# Altium integrated library Relays.IntLib: 47 symbols
Pins are listed as number, name and electrical type; pins without a type are passive.

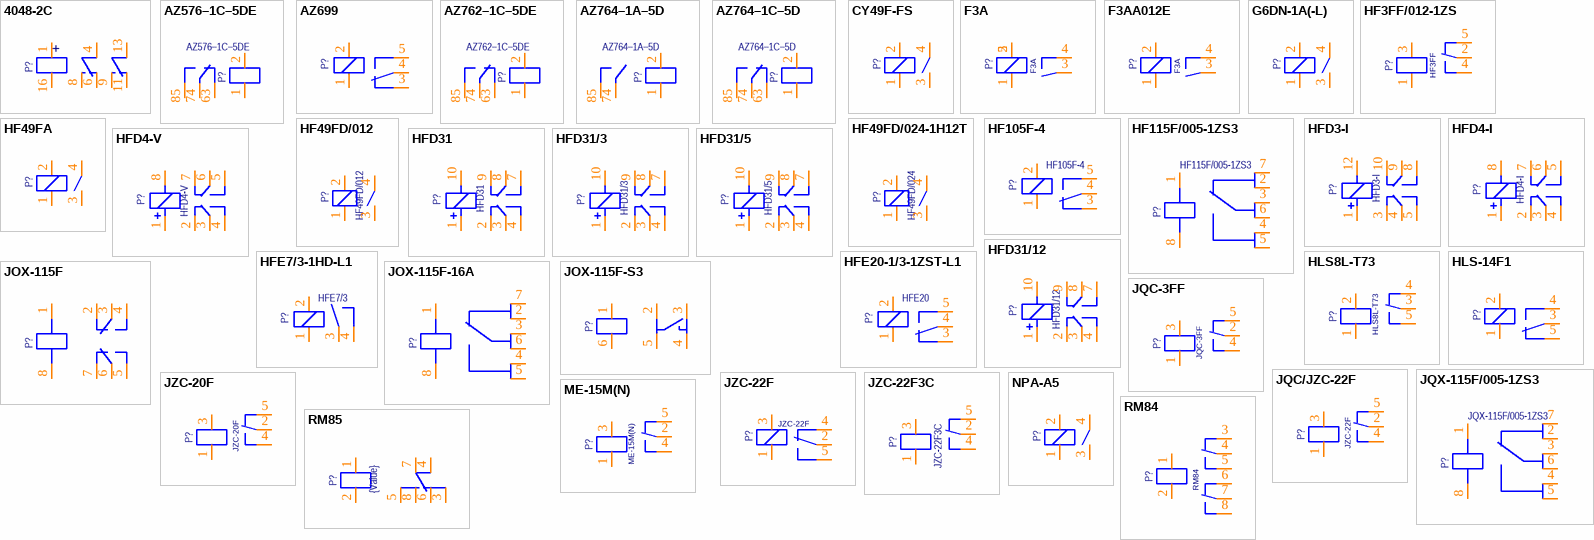
[diagram p0: symbols 4048-2C to RM85]

## 4048-2C
designator P?  (value not drawn)
Value: {Value}; Note: Relays; Temp.Characteristic: -40C to +85C; Coil voltage form: DC AC; Contact arrangement: 1 Form C, 1 Form B, 1 Form A; Publisher: Catcatcat Electronics; website developer: http://catcatcat.d-lan.dp.ua/; Assembly type: Manual Part
footprint REL-2F
pins: 1 -, 4 con, 6 rst, 8 set, 9 set, 11 rst, 13 con, 16 +

## AZ576–1C–5DE
designator P?
1 Form C 20 Amp switching; Note: Relays; Temp.Characteristic: -40C to +85C; Coil resistance（Ω）: 62; Coil voltage: 5V; Coil voltage form: DC; Contact arrangement: 1 Form C; Electrial eddurance min: 100000; Package / Case: DIP; Publisher: Catcatcat Electronics; HelpURL: https://www.azettler.com/pdfs/az576.pdf; Manufacturer PartNumber: AZ576–1C–5DE; website developer: http://catcatcat.d-lan.dp.ua/; Assembly type: Manual Part; Value: AZ576–1C–5DE
footprint AZ764 1 Form C (1 Form C)
pins: 1, 2, 63, 74, 85

## AZ699
designator P?  (value not drawn)
Value: {Value}; Note: Relays; Temp.Characteristic: -40C to +85C; Coil voltage form: DC AC; Contact arrangement: 1 Form C, 1 Form B, 1 Form A; Publisher: Catcatcat Electronics; website developer: http://catcatcat.d-lan.dp.ua/; Assembly type: Manual Part
footprint V23092-A1012-A302
pins: 1, 2, 3, 4, 5

## AZ762–1C–5DE
designator P?
16 Amp switching; Note: Relays; Temp.Characteristic: -40C to +85C; Coil resistance（Ω）: 62; Coil voltage: 5V; Coil voltage form: DC; Contact arrangement: 1 Form C; Electrial eddurance min: 100000; Package / Case: DIP; Publisher: Catcatcat Electronics; HelpURL: https://www.azettler.com/pdfs/az762.pdf; Manufacturer PartNumber: AZ762–1C–5DE; website developer: http://catcatcat.d-lan.dp.ua/; Assembly type: Manual Part; Value: AZ762–1C–5DE
footprint AZ762
pins: 1, 2, 63, 74, 85

## AZ764–1A–5D
designator P?
1 Form A 16 Amp switching; Note: Relays; Temp.Characteristic: -40C to +85C; Coil resistance（Ω）: 62; Coil voltage: 5V; Coil voltage form: DC; Contact arrangement: 1 Form A; Electrial eddurance min: 100000; Package / Case: DIP; Publisher: Catcatcat Electronics; HelpURL: https://www.azettler.com/pdfs/az764.pdf; Manufacturer PartNumber: AZ764–1A–5D; website developer: http://catcatcat.d-lan.dp.ua/; Assembly type: Manual Part; Value: AZ764–1A–5D
footprint AZ764 1 Form A (1 Form A)
pins: 1, 2, 74, 85

## AZ764–1C–5D
designator P?
1 Form C 16 Amp switching; Note: Relays; Temp.Characteristic: -40C to +85C; Coil resistance（Ω）: 62; Coil voltage: 5V; Coil voltage form: DC; Contact arrangement: 1 Form C; Electrial eddurance min: 100000; Package / Case: DIP; Publisher: Catcatcat Electronics; HelpURL: https://www.azettler.com/pdfs/az764.pdf; Manufacturer PartNumber: AZ764–1C–5D; website developer: http://catcatcat.d-lan.dp.ua/; Assembly type: Manual Part; Value: AZ764–1C–5D
footprint AZ764 1 Form C (1 Form C)
pins: 1, 2, 63, 74, 85

## CY49F-FS
designator P?  (value not drawn)
Value: {Value}; Note: Relays; Temp.Characteristic: -40C to +85C; Coil voltage form: DC AC; Contact arrangement: 1 Form C, 1 Form B, 1 Form A; Publisher: Catcatcat Electronics; website developer: http://catcatcat.d-lan.dp.ua/; Assembly type: Manual Part
footprint CY49F-xVDC-F-x
footprint CY49F-xVDC-FS-x
footprint CY49F-xVDC-S-x
pins: 1, 2, 3, 4

## F3A
designator P?  (value not drawn)
Value: {Value}; Note: Relays; Temp.Characteristic: -40C to +85C; Coil voltage form: DC AC; Contact arrangement: 1 Form C, 1 Form B, 1 Form A; Publisher: Catcatcat Electronics; website developer: http://catcatcat.d-lan.dp.ua/; Assembly type: Manual Part
footprint F3AA012E
pins: 1, 2, 3, 4, 5

## F3AA012E
designator P?  (value not drawn)
Value: {Value}; Note: Relays; Temp.Characteristic: -40C to +85C; Coil voltage form: DC AC; Contact arrangement: 1 Form C, 1 Form B, 1 Form A; Publisher: Catcatcat Electronics; website developer: http://catcatcat.d-lan.dp.ua/; Assembly type: Manual Part
footprint F3AA012E
pins: 1, 2, 3, 4
text: F3A

## G6DN-1A(-L)
designator P?  (value not drawn)
Value: {Value}; Note: Relays; Temp.Characteristic: -40C to +85C; Coil voltage form: DC AC; Contact arrangement: 1 Form C, 1 Form B, 1 Form A; Publisher: Catcatcat Electronics; website developer: http://catcatcat.d-lan.dp.ua/; Assembly type: Manual Part
footprint G6DN-1A(-L) (5 A)
pins: 1, 2, 3, 4

## HF3FF/012-1ZS
designator P?  (value not drawn)
10 A (12VDC); Value: HF3FF/012-1ZS; Pricing Аlternative: 0.12; Note: Relays; Temp.Characteristic: -40C to +85C; Voltage: 12 V; Coil voltage form: DC AC; Contact arrangement: 1 Form C, 1 Form B, 1 Form A; Package / Case: DIP; Pricing Digi-Key: 0.45; Publisher: Catcatcat Electronics; website developer: http://catcatcat.d-lan.dp.ua/; Assembly type: Manual Part
footprint JZC-20F
pins: 1, 2 con, 3, 4 rs, 5 set
text: HF3FF

## HF49FA
designator P?  (value not drawn)
Value: {Value}; Note: Relays; Temp.Characteristic: -40C to +85C; Coil voltage form: DC AC; Contact arrangement: 1 Form C, 1 Form B, 1 Form A; Publisher: Catcatcat Electronics; website developer: http://catcatcat.d-lan.dp.ua/; Assembly type: Manual Part
footprint HF49FA
pins: 1, 2, 3, 4

## HF49FD/012
designator P?
12VDC 5A; Note: Relays; Temp.Characteristic: -40C to +85C; Coil resistance（Ω）: 120 Ohm; Coil voltage: 12V; Coil voltage form: DC; Contact arrangement: 1 Form C, 1 Form B, 1 Form A; Package / Case: DIP; Publisher: Catcatcat Electronics; HelpURL: http://www.hongfa.com:8080/pdfjs/web/viewer.html?file=/Uploads/PDF/HF49FD_I_en.pdf&stamp=1582546701746; website developer: http://catcatcat.d-lan.dp.ua/; Assembly type: Manual Part; Value: HF49FD/012
footprint HF49FD
footprint HF49FD/***1H*1
footprint HF49FD/***1H*2
pins: 1, 2, 3, 4

## HF49FD/024-1H12T
designator P?  value HF49FD/024  (hidden comment: HF49FD/024-1H12T)
24VDC 5A; Note: Relays; Temp.Characteristic: -40C to +85C; Coil resistance（Ω）: 120 Ohm; Coil voltage: 24V; Coil voltage form: DC; Contact arrangement: 1 Form C, 1 Form B, 1 Form A; Package / Case: DIP; Publisher: Catcatcat Electronics; HelpURL: http://www.hongfa.com:8080/pdfjs/web/viewer.html?file=/Uploads/PDF/HF49FD_I_en.pdf&stamp=1582546701746; website developer: http://catcatcat.d-lan.dp.ua/; Assembly type: Manual Part
footprint HF49FD
footprint HF49FD/***1H*1
footprint HF49FD/***1H*2
pins: 1, 2, 3, 4

## HF105F-4
designator P?  value HF105F-4  (hidden comment: *)
Реле 1form-A coil=220vac cont=40a 277vac; Manufacturer PartNumber: HF105F-4/220A-1HST; PartNumber Аlternative: HF105F-4/220A-1HST(136); Note: Relays; Temp.Characteristic: -40C to +85C; Coil resistance（Ω）: 13490; Coil voltage: 220V; Coil voltage form: AC; Contact arrangement: 1 Form A; Dealer Аlternative: http://www.microchip.ua/index.php?p=view_prod.php&leng=rus&tl=%CF%F0%EE%E4%F3%EA%F6%E8%FF&tlp=%DD%EB%E5%EA%F2%F0%EE%EC%E5%F5%E0%ED%E8%F7%E5%F1%EA%E8%E5%20%F0%E5%EB%E5&pmen=%D0%E5%EB%E5%20%FD%EB%E5%EA%F2%F0%EE%EC%E0%E3%ED%E8%F2%ED%FB%E5&razd=RAZD062&npm=12&ipm=0&st=3#up; Package / Case: DIP; Publisher: Catcatcat Electronics; HelpURL: http://www.hongfa.com:8080/pdfjs/web/viewer.html?file=/Uploads/PDF/HF105F-4_en.pdf&stamp=1566114387661; website developer: http://catcatcat.d-lan.dp.ua/; Detailed Description: http://www.hongfa.com; Assembly type: Manual Part
footprint HF105F-4
pins: 1, 2, 3, 4, 5

## HF115F/005-1ZS3
designator P?  value HF115F/005-1ZS3  (hidden comment: *)
5VDC SPDT 16A (440VAC , 300VDC) Max DIP RoHS; Manufacturer: Xiamen Hongfa Electroacoustic; PartNumber Аlternative: Реле JQX-115F 16A 1C coil 5VDC; Pricing Аlternative: 1.350; Note: Relays; Temp.Characteristic: -40C to +85C; Detailed Description: Relays General Purpose Non Latching 5VDC SPDT 16A (440VAC , 300VDC) Max DIP RoHS; Coil resistance（Ω）: 62; Coil voltage: 5V; Coil voltage form: DC; Contact arrangement: 1 Form C; Electrial eddurance min: 100000; Dealer Аlternative: https://voron.ua/catalog/017097; Package / Case: DIP; Publisher: Catcatcat Electronics; HelpURL: http://www.hongfa.com:8080/pdfjs/web/viewer.html?file=/Uploads/PDF/HF115F_i_en.pdf&stamp=1566119198551; Manufacturer PartNumber: HF115F/005-1ZS3; website developer: http://catcatcat.d-lan.dp.ua/; Dealer LCSC: https://lcsc.com/product-detail/Relays_HF115F-05-1ZS3_C9225.html; Manufacturer URL: http://www.hongfa.com/product/detail/e692adbc-7799-469a-98dc-d1d105d3370d; PartNumber LCSC: C9225; Pricing LCSC: 1.3879; Assembly type: Manual Part
footprint HF115F/_1_3 1 Form C
footprint HF115F/_1_3 1 Form C no3D
pins: 1, 2, 3, 4, 5, 6, 7, 8

## HFD3-I
designator P?
Note: Relays; Temp.Characteristic: -40C to +85C; Voltage: 5V; Coil resistance（Ω）: 13490; Coil voltage form: DC; Contact arrangement: 1 Form A; Package / Case: DIP; Publisher: Catcatcat Electronics; website developer: http://catcatcat.d-lan.dp.ua/; Coil voltage: 5V; Assembly type: Manual Part; Value: HFD3-I
footprint HFD3-I DIP (DIP)
footprint HFD3-I S (S)
pins: 1, 3, 4, 5, 8, 9, 10, 12

## HFD4-I
designator P?
Note: Relays; Temp.Characteristic: -40C to +85C; Voltage: 5V; Coil resistance（Ω）: 13490; Coil voltage form: DC; Contact arrangement: 1 Form A; Package / Case: DIP; Publisher: Catcatcat Electronics; website developer: http://catcatcat.d-lan.dp.ua/; Coil voltage: 5V; Assembly type: Manual Part; Value: HFD4-I
footprint HFD4-I DIP (DIP)
footprint HFD4-I SMT
footprint HFD4-I SMT sh
pins: 1, 2, 3, 4, 5, 6, 7, 8

## HFD4-V
designator P?
Note: Relays; Temp.Characteristic: -40C to +85C; Voltage: 5V; Coil resistance（Ω）: 13490; Coil voltage form: DC; Contact arrangement: 1 Form A; Package / Case: DIP; Publisher: Catcatcat Electronics; website developer: http://catcatcat.d-lan.dp.ua/; Coil voltage: 5V; Assembly type: Manual Part; Value: HFD4-V
footprint HFD4-I DIP (DIP)
footprint HFD4-I SMT
footprint HFD4-I SMT sh
pins: 1, 2, 3, 4, 5, 6, 7, 8

## HFD31
designator P?
Note: Relays; Temp.Characteristic: -40C to +85C; Voltage: 5V; Coil resistance（Ω）: 13490; Coil voltage form: DC; Contact arrangement: 1 Form A; Package / Case: DIP; Publisher: Catcatcat Electronics; website developer: http://catcatcat.d-lan.dp.ua/; Coil voltage: 5V; Assembly type: Manual Part; Value: HFD31
footprint HFD31 (DIP)
footprint HFD31 SMT (SMT)
pins: 1, 2, 3, 4, 7, 8, 9, 10

## HFD31/3
designator P?
3VDC DPDT 2A; Manufacturer: Xiamen Hongfa Electroacoustic; Note: Relays; Temp.Characteristic: -40C to +85C; Voltage: 5VDC 2A; Detailed Description: Relays Telecom Non Latching 5VDC DPDT 2A (250VAC , 220VDC) Max Plugin RoHS; Coil resistance（Ω）: 13490; Coil voltage: 5V; Coil voltage form: DC; Package / Case: DIP; Publisher: Catcatcat Electronics; HelpURL: http://www.hongfa.com:8080/pdfjs/web/viewer.html?file=/Uploads/PDF/HFD31_en.pdf; Manufacturer PartNumber: HFD31/3; website developer: http://catcatcat.d-lan.dp.ua/; PartNumber Mouser: http://www.hongfa.com:8080/pdfjs/web/viewer.html?file=/Uploads/PDF/HFD31_en.pdf&stamp=1582545623043; Contact arrangement: DPDT; Assembly type: Manual Part; Value: HFD31/3
footprint HFD31 (DIP)
footprint HFD31 SMT (SMT)
pins: 1, 2, 3, 4, 7, 8, 9, 10

## HFD31/5
designator P?
5VDC DPDT 2A; Manufacturer: Xiamen Hongfa Electroacoustic; Note: Relays; Temp.Characteristic: -40C to +85C; Voltage: 5VDC 2A; Detailed Description: Relays Telecom Non Latching 5VDC DPDT 2A (250VAC , 220VDC) Max Plugin RoHS; Coil resistance（Ω）: 13490; Coil voltage: 5V; Coil voltage form: DC; Package / Case: DIP; Publisher: Catcatcat Electronics; HelpURL: http://www.hongfa.com:8080/pdfjs/web/viewer.html?file=/Uploads/PDF/HFD31_en.pdf; Manufacturer PartNumber: HFD31/5; website developer: http://catcatcat.d-lan.dp.ua/; Contact arrangement: DPDT; Assembly type: Manual Part; Value: HFD31/5
footprint HFD31 (DIP)
footprint HFD31 SMT (SMT)
pins: 1, 2, 3, 4, 7, 8, 9, 10

## HFD31/12
designator P?
12VDC DPDT 2A; Manufacturer: Xiamen Hongfa Electroacoustic; Note: Relays; Temp.Characteristic: -40C to +85C; Voltage: 12VDC 2A; Detailed Description: Relays Telecom Non Latching 5VDC DPDT 2A (250VAC , 220VDC) Max Plugin RoHS; Coil resistance（Ω）: 13490; Coil voltage: 5V; Coil voltage form: DC; Package / Case: DIP; Publisher: Catcatcat Electronics; HelpURL: http://www.hongfa.com:8080/pdfjs/web/viewer.html?file=/Uploads/PDF/HFD31_en.pdf; Manufacturer PartNumber: HFD31/12; website developer: http://catcatcat.d-lan.dp.ua/; Contact arrangement: DPDT; Assembly type: Manual Part; Value: HFD31/12
footprint HFD31 (DIP)
footprint HFD31 SMT (SMT)
pins: 1, 2, 3, 4, 7, 8, 9, 10

## HFE7/3-1HD-L1
designator P?  value HFE7/3  (hidden comment: HFE7/3-1HD-L1)
Реле 1form-A coil=3vdc cont=10a 277vac поляризованое (latching); PartNumber Аlternative: HF105F-4/220A-1HST(136); Note: Relays; Temp.Characteristic: -40C to +85C; Coil resistance（Ω）: 13490; Coil voltage: 220V; Coil voltage form: AC; Contact arrangement: 1 Form A; Dealer Аlternative: http://www.microchip.ua; Package / Case: DIP; Publisher: Catcatcat Electronics; HelpURL: http://www.hongfa.com:8080/pdfjs/web/viewer.html?file=/Uploads/PDF/HFE7_en.pdf&stamp=1603382990751; Manufacturer PartNumber: HFE7/3-1HD-L1; website developer: http://catcatcat.d-lan.dp.ua/; Detailed Description: http://www.hongfa.com; Assembly type: Manual Part
footprint HFE7/3-1HD-L1 1 Form A
pins: 1, 2, 3 4, 4 5

## HFE20-1/3-1ZST-L1
designator P?  value HFE20  (hidden comment: HFE20-1/3-1ZST-L1)
Реле 1form-C coil=3vdc cont=16a 277vac поляризованое (latching); PartNumber Аlternative: HF105F-4/220A-1HST(136); Note: Relays; Temp.Characteristic: -40C to +85C; Coil resistance（Ω）: 13490; Coil voltage: 220V; Coil voltage form: AC; Contact arrangement: 1 Form A; Dealer Аlternative: http://www.microchip.ua; Package / Case: DIP; Publisher: Catcatcat Electronics; HelpURL: http://www.hongfa.com:8080/pdfjs/web/viewer.html?file=/Uploads/PDF/HFE20_en.pdf&stamp=1603385578102; Manufacturer PartNumber: HFE20-1/3-1ZST-L1; website developer: http://catcatcat.d-lan.dp.ua/; Detailed Description: http://www.hongfa.com; Assembly type: Manual Part
footprint HFE20
pins: 1, 2, 3, 4, 5

## HLS8L-T73
designator P?  (value not drawn)
Value: {Value}; Note: Relays; Temp.Characteristic: -40C to +85C; Coil voltage form: DC AC; Contact arrangement: 1 Form C, 1 Form B, 1 Form A; Publisher: Catcatcat Electronics; website developer: http://catcatcat.d-lan.dp.ua/; Assembly type: Manual Part
footprint HLS8L-T73
pins: 1, 2, 3, 4, 5

## HLS-14F1
designator P?  (value not drawn)
Value: {Value}; Note: Relays; Temp.Characteristic: -40C to +85C; Coil voltage form: DC AC; Contact arrangement: 1 Form C, 1 Form B, 1 Form A; Publisher: Catcatcat Electronics; website developer: http://catcatcat.d-lan.dp.ua/; Assembly type: Manual Part
footprint HLS-14F1
pins: 1, 2, 3, 4, 5

## JOX-115F
designator P?  (value not drawn)
Value: {Value}; Note: Relays; Temp.Characteristic: -40C to +85C; Coil voltage form: DC AC; Contact arrangement: 1 Form C, 1 Form B, 1 Form A; Publisher: Catcatcat Electronics; website developer: http://catcatcat.d-lan.dp.ua/; Assembly type: Manual Part
footprint JOX-115F
pins: 1, 2, 3, 4, 5, 6, 7, 8

## JOX-115F-16A
designator P?  (value not drawn)
Value: {Value}; Note: Relays; Temp.Characteristic: -40C to +85C; Coil voltage form: DC AC; Contact arrangement: 1 Form C, 1 Form B, 1 Form A; Publisher: Catcatcat Electronics; website developer: http://catcatcat.d-lan.dp.ua/; Assembly type: Manual Part
footprint JOX-115F
pins: 1, 2, 3, 4, 5, 6, 7, 8

## JOX-115F-S3
designator P?  (value not drawn)
Value: {Value}; Note: Relays; Temp.Characteristic: -40C to +85C; Coil voltage form: DC AC; Contact arrangement: 1 Form C, 1 Form B, 1 Form A; Publisher: Catcatcat Electronics; website developer: http://catcatcat.d-lan.dp.ua/; Assembly type: Manual Part
footprint JOX-115F-S3
pins: 1, 2, 3, 4, 5, 6

## JQC-3FF
designator P?  (value not drawn)
10 A (12VDC); Value: 10 A; Pricing Аlternative: 0.12; Note: Relays; Temp.Characteristic: -40C to +85C; Voltage: 12 V; Coil voltage form: DC AC; Contact arrangement: 1 Form C, 1 Form B, 1 Form A; ComponentLink2URL: http://www.massuse-relay.com/details/English/ME-15M.pdf; Package / Case: DIP; PartNumber Digi-Key: JQC-3FF 012VDC 1H T F S; Pricing Digi-Key: 0.45; Publisher: Catcatcat Electronics; website developer: http://catcatcat.d-lan.dp.ua/; Assembly type: Manual Part
footprint JZC-20F
pins: 1, 2 con, 3, 4 rs, 5 set

## JQC/JZC-22F
designator P?  (value not drawn)
10 A (12VDC); Value: 10 A; Pricing Аlternative: 0.12; Note: Relays; Temp.Characteristic: -40C to +85C; Voltage: 12 V; Coil voltage form: DC AC; Contact arrangement: 1 Form C, 1 Form B, 1 Form A; Package / Case: DIP; PartNumber Digi-Key: JQC/JZC-22F 012VDC 1H S; Pricing Digi-Key: 0.45; Publisher: Catcatcat Electronics; website developer: http://catcatcat.d-lan.dp.ua/; Assembly type: Manual Part
footprint JZC-20F
pins: 1, 2 con, 3, 4 rs, 5 set
text: JZC-22F

## JQX-115F/005-1ZS3
designator P?  value JQX-115F/005-1ZS3  (hidden comment: *)
5VDC SPDT 16A (440VAC , 300VDC) Max DIP RoHS; Manufacturer: Xiamen Hongfa Electroacoustic; PartNumber Аlternative: Реле JQX-115F 16A 1C coil 5VDC; Pricing Аlternative: 1.350; Note: Relays; Temp.Characteristic: -40C to +85C; Coil resistance（Ω）: 62; Coil voltage: 5V; Coil voltage form: DC; Contact arrangement: 1 Form C; Electrial eddurance min: 100000; Dealer Аlternative: https://voron.ua/catalog/017097; Package / Case: DIP; Publisher: Catcatcat Electronics; HelpURL: https://datasheet.lcsc.com/szlcsc/Xiamen-Hongfa-Electroacoustic-JQX-115F-005-1ZS3_C67589.pdf; Manufacturer PartNumber: JQX-115F/005-1ZS3; website developer: http://catcatcat.d-lan.dp.ua/; Dealer LCSC: https://lcsc.com/product-detail/Relays_JQX-115F-005-1ZS3_C67589.html; Manufacturer URL: http://www.hongfa.com/product/detail/e692adbc-7799-469a-98dc-d1d105d3370d; PartNumber LCSC: C67589; Pricing LCSC: 1.3894; Assembly type: Manual Part
footprint HF115F/_1_3 1 Form C
pins: 1, 2, 3, 4, 5, 6, 7, 8

## JZC-20F
designator P?  (value not drawn)
Value: {Value}; Note: Relays; Temp.Characteristic: -40C to +85C; Coil voltage form: DC AC; Contact arrangement: 1 Form C, 1 Form B, 1 Form A; Publisher: Catcatcat Electronics; website developer: http://catcatcat.d-lan.dp.ua/; Assembly type: Manual Part
footprint JZC-20F
pins: 1, 2 con, 3, 4 rs, 5 set

## JZC-22F
designator P?  (value not drawn)
12VDC, 1Z 15 A; Value: 15 A; Pricing Аlternative: 0.25; Note: Relays; Temp.Characteristic: -40C to +85C; Voltage: 12 V; Coil voltage form: DC AC; Contact arrangement: 1 Form C, 1 Form B, 1 Form A; ComponentLink1URL: www.chinarelay.com; ComponentLink2URL: http://relays.chinarelay.com; Dealer Digi-Key: ASIA DRAGON ELECTRIC CO.,LTD [Asiaon]; Package / Case: DIP; PartNumber Digi-Key: JZC-22F 12VDC, 1H; Publisher: Catcatcat Electronics; website developer: http://catcatcat.d-lan.dp.ua/; Assembly type: Manual Part
footprint JZC-22FSC
pins: 1, 2, 3, 4, 5

## JZC-22F3C
designator P?  value JZC-22F3C  (hidden comment: *)
16 A (12VDC); Pricing Аlternative: 0.24; Note: Relays; Temp.Characteristic: -40C to +85C; Voltage: 12 V; Coil voltage form: DC AC; Contact arrangement: 1 Form C, 1 Form B, 1 Form A; Dealer Digi-Key: https://detail.1688.com/offer/547234947025.html; PartNumber Digi-Key: JZC-22F3C 012VDC 1H S; Pricing Digi-Key: 0.45; Publisher: Catcatcat Electronics; PackageType: DIP; website developer: http://catcatcat.d-lan.dp.ua/; Assembly type: Manual Part
footprint JZC-20F
pins: 1, 2 con, 3, 4 rs, 5 set

## ME-15M(N)
designator P?  (value not drawn)
10 A (12VDC); Value: 10 A; Pricing Аlternative: 0.12; Note: Relays; Temp.Characteristic: -40C to +85C; Voltage: 12 V; Coil voltage form: DC AC; Contact arrangement: 1 Form C, 1 Form B, 1 Form A; ComponentLink2URL: http://www.massuse-relay.com/details/English/ME-15M.pdf; Package / Case: DIP; PartNumber Digi-Key: ME-15M(N) 012VDC H T F S; Pricing Digi-Key: 0.45; Publisher: Catcatcat Electronics; website developer: http://catcatcat.d-lan.dp.ua/; Assembly type: Manual Part
footprint JZC-20F
pins: 1, 2 con, 3, 4 rs, 5 set

## NPA-A5
designator P?  (value not drawn)
Value: {Value}; Note: Relays; Temp.Characteristic: -40C to +85C; Coil voltage form: DC AC; Contact arrangement: 1 Form C, 1 Form B, 1 Form A; Publisher: Catcatcat Electronics; website developer: http://catcatcat.d-lan.dp.ua/; Assembly type: Manual Part
footprint NPA-A5
pins: 1, 2, 3, 4

## RM84
designator P?  (value not drawn)
Value: {Value}; Note: Relays; Temp.Characteristic: -40C to +85C; Coil voltage form: DC AC; Contact arrangement: 1 Form C, 1 Form B, 1 Form A; Publisher: Catcatcat Electronics; website developer: http://catcatcat.d-lan.dp.ua/; Assembly type: Manual Part
footprint RM84
pins: 1, 2, 3, 4, 5, 6, 7, 8

## RM85
designator P?  value {Value}  (hidden comment: *)
Note: Relays; Temp.Characteristic: -40C to +85C; Coil voltage form: DC AC; Contact arrangement: 1 Form C, 1 Form B, 1 Form A; Publisher: Catcatcat Electronics; website developer: http://catcatcat.d-lan.dp.ua/; Assembly type: Manual Part
footprint RM84
pins: 1 -, 2 +, 3 rst, 4 con, 5 set, 6 rst, 7 con, 8 set

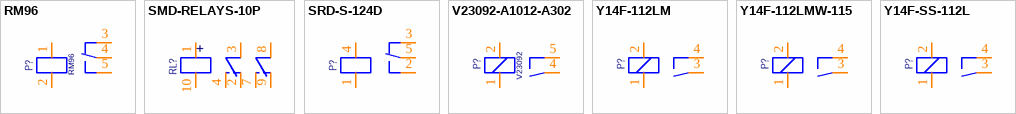
[diagram p1: symbols RM96 to Y14F-SS-112L]

## RM96
designator P?  (value not drawn)
Value: {Value}; Note: Relays; Temp.Characteristic: -40C to +85C; Coil voltage form: DC AC; Contact arrangement: 1 Form C, 1 Form B, 1 Form A; Publisher: Catcatcat Electronics; website developer: http://catcatcat.d-lan.dp.ua/; Assembly type: Manual Part
footprint RM96
pins: 1, 2, 3, 4, 5

## SMD-RELAYS-10P
designator RL?  (value not drawn)
Value: {Value}; Note: Relays; Temp.Characteristic: -40C to +85C; Coil voltage form: DC AC; Contact arrangement: 1 Form C, 1 Form B, 1 Form A; Publisher: Catcatcat Electronics; website developer: http://catcatcat.d-lan.dp.ua/; Assembly type: Manual Part
footprint SMD-RELAYS
pins: 1, 2 rs, 3 con, 4 set, 5 hidden, 6 hidden, 7 set, 8 con, 9 rs, 10
text: +

## SRD-S-124D
designator P?  (value not drawn)
24VDC SPDT 12A Through Hole Relays RoHS; Manufacturer: SANYOU RELAYS; Manufacturer PartNumber: SRD-S-124D; Temp.Characteristic: -40C to +85C; Voltage: (277VAC) Max; Detailed Description: General Purpose Latching, Single Coil 24VDC SPDT 12A Through Hole Relays RoHS; Coil resistance（Ω）: 1500; Coil voltage: 24; Coil voltage form: DC AC; Contact arrangement: 1 Form C, 1 Form B, 1 Form A; Value: 12A; ComponentLink2URL: http://www.massuse-relay.com/details/English/ME-15M.pdf; Package / Case: Through Hole; Publisher: Catcatcat Electronics; Note: Relays; HelpURL: https://datasheet.lcsc.com/szlcsc/1809211229_SANYOU-RELAYS-SRD-S-124D_C276435.pdf; website developer: http://catcatcat.d-lan.dp.ua/; PartNumber LCSC: C276435; Pricing LCSC: 0.518333; Assembly type: Manual Part
footprint SRD-S relays
pins: 1, 2 rs, 3 set, 4, 5 con

## V23092-A1012-A302
designator P?  (value not drawn)
Value: {Value}; Note: Relays; Temp.Characteristic: -40C to +85C; Coil voltage form: DC AC; Contact arrangement: 1 Form C, 1 Form B, 1 Form A; Publisher: Catcatcat Electronics; website developer: http://catcatcat.d-lan.dp.ua/; Assembly type: Manual Part
footprint V23092-A1012-A302
pins: 1, 2, 4, 5
text: V23092

## Y14F-112LM
designator P?  (value not drawn)
29.2*12.8*20.6mm; Value: 16A 1A; Note: Relays; Temp.Characteristic: -40C to +85C; Voltage: 12VDC; Coil voltage form: DC AC; Contact arrangement: 1 Form C, 1 Form B, 1 Form A; ComponentLink1URL: https://detail.1688.com/offer/43514657287.html?spm=a2615.7691456.0.0.d3059e2DYG2du; ComponentLink2URL: http://www.yzrelay.com/products/electromagneticrelay/78.html; Publisher: Catcatcat Electronics; Manufacturer: http://www.yzrelay.com/; website developer: http://catcatcat.d-lan.dp.ua/; Assembly type: Manual Part
footprint Y14F-112LM (29.2*12.8*20.6mm)
pins: 1, 2, 3, 4

## Y14F-112LMW-115
designator P?  (value not drawn)
29.2*12.8*15.7mm; Value: 20A 1A; Note: Relays; Temp.Characteristic: -40C to +85C; Voltage: 12VDC; Coil voltage form: DC AC; Contact arrangement: 1 Form C, 1 Form B, 1 Form A; ComponentLink1URL: http://www.yzrelay.com/products/electromagneticrelay/76.html; ComponentLink2URL: https://detail.1688.com/offer/522018460035.html?spm=b26110380.sw1688.mof001.13.La7iS8; Publisher: Catcatcat Electronics; Manufacturer: http://www.yzrelay.com/; website developer: http://catcatcat.d-lan.dp.ua/; Assembly type: Manual Part
footprint Y14F-112LMW-115 (29.2*12.8*15.7mm)
pins: 1, 2, 3, 4

## Y14F-SS-112L
designator P?  (value not drawn)
29.2*12.8*20.6mm; Value: 16A 1A; Pricing Аlternative: 0.352; Note: Relays; Temp.Characteristic: -40C to +85C; Voltage: 12VDC; Coil voltage form: DC AC; Contact arrangement: 1 Form C, 1 Form B, 1 Form A; ComponentLink1URL: http://www.yzrelay.com/products/electromagneticrelay/7_4.html; ComponentLink2URL: http://www.yzrelay.com/products/electromagneticrelay/78.html; Dealer Digi-Key: http://www.yzrelay.com/products/electromagneticrelay/7_4.html; Publisher: Catcatcat Electronics; Manufacturer: http://www.yzrelay.com/; website developer: http://catcatcat.d-lan.dp.ua/; Assembly type: Manual Part
footprint Y14F-SS-112L (29.2*12.6*20.1mm)
pins: 1, 2, 3, 4